# Altium integrated library Altium_WCAP-ATLI_rev19a.IntLib: 162 symbols (part 2 of 2)
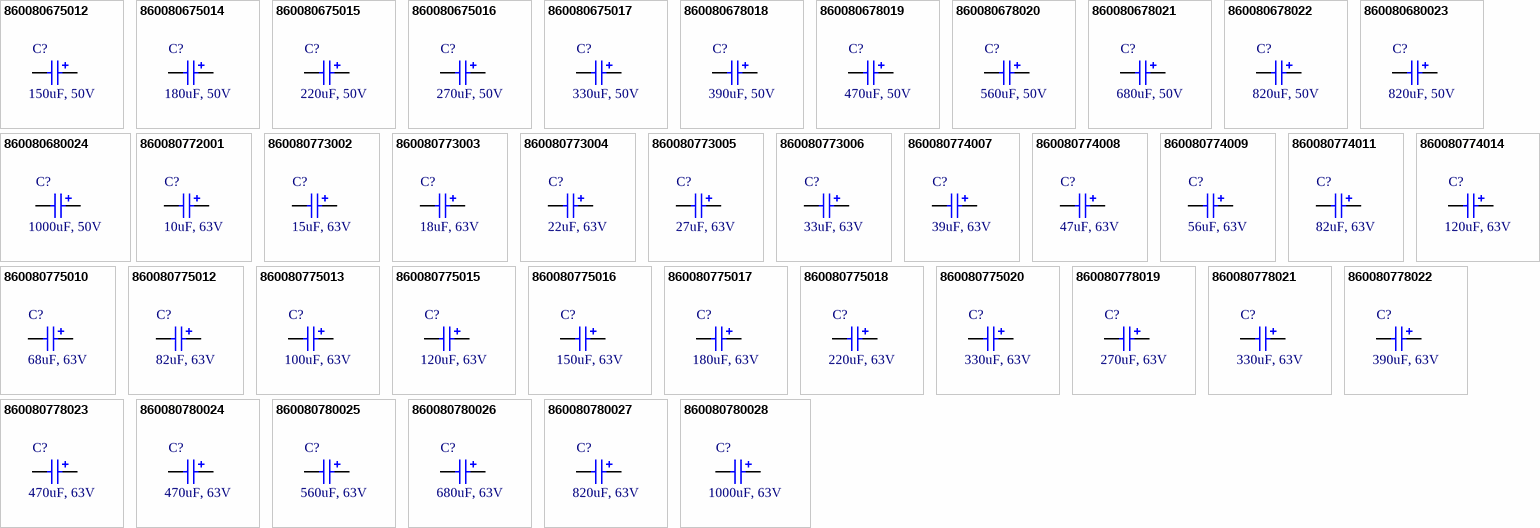
[diagram p5: symbols 860080675012 to 860080780028]

## 860080775010
designator C?, comment 68uF, 63V
WCAP-ATLI THT Aluminum Electrolytic Capacitors, D10mm x L12.5mm, 68uF, +/-20%, 63VDC; Part Number: 860080775010; Dissipation Factor: 8%; Endurance: 5000h; Leakage Current: 42.84uA; Ripple Current max.: 500mA; Technical Reference: ATEF125680M063DSPA9E000; ComponentLink1Description: Manufacturer; ComponentLink1URL: http://www.we-online.de; ComponentLink2Description: Datasheet; ComponentLink2URL: https://katalog.we-online.com/pbs/datasheet/860080775010.pdf; Length: 12.5mm; Mounting Technology: THT; Operating Temperature: -55 to +105degC; Packaging: Ammo Pack; Published Date: August 2019; Capacitance: 68uF; Diameter: 10mm; Publisher: Wurth Elektronik; Capacitance Tolerance: +/-20%; Rated Voltage: 63VDC
footprint WCAP-ATLI_10x12.5
pins: 1 N, 2 P

## 860080775012
designator C?, comment 82uF, 63V
WCAP-ATLI THT Aluminum Electrolytic Capacitors, D10mm x L12.5mm, 82uF, +/-20%, 63VDC; Part Number: 860080775012; Dissipation Factor: 8%; Endurance: 5000h; Leakage Current: 51.66uA; Ripple Current max.: 570mA; Technical Reference: ATEF125820M063DSPA9E000; ComponentLink1Description: Manufacturer; ComponentLink1URL: http://www.we-online.de; ComponentLink2Description: Datasheet; ComponentLink2URL: https://katalog.we-online.com/pbs/datasheet/860080775012.pdf; Length: 12.5mm; Mounting Technology: THT; Operating Temperature: -55 to +105degC; Packaging: Ammo Pack; Published Date: August 2019; Capacitance: 82uF; Diameter: 10mm; Publisher: Wurth Elektronik; Capacitance Tolerance: +/-20%; Rated Voltage: 63VDC
footprint WCAP-ATLI_10x12.5
pins: 1 N, 2 P

## 860080775013
designator C?, comment 100uF, 63V
WCAP-ATLI THT Aluminum Electrolytic Capacitors, D10mm x L12.5mm, 100uF, +/-20%, 63VDC; Part Number: 860080775013; Dissipation Factor: 8%; Endurance: 5000h; Leakage Current: 63uA; Ripple Current max.: 720mA; Technical Reference: ATEF125101M063DSPA9E000; ComponentLink1Description: Manufacturer; ComponentLink1URL: http://www.we-online.de; ComponentLink2Description: Datasheet; ComponentLink2URL: https://katalog.we-online.com/pbs/datasheet/860080775013.pdf; Length: 12.5mm; Mounting Technology: THT; Operating Temperature: -55 to +105degC; Packaging: Ammo Pack; Published Date: August 2019; Capacitance: 100uF; Diameter: 10mm; Publisher: Wurth Elektronik; Capacitance Tolerance: +/-20%; Rated Voltage: 63VDC
footprint WCAP-ATLI_10x12.5
pins: 1 N, 2 P

## 860080775015
designator C?, comment 120uF, 63V
WCAP-ATLI THT Aluminum Electrolytic Capacitors, D10mm x L16mm, 120uF, +/-20%, 63VDC; Part Number: 860080775015; Dissipation Factor: 8%; Endurance: 5000h; Leakage Current: 75.6uA; Ripple Current max.: 835mA; Technical Reference: ATEF160121M063DSPAAE000; ComponentLink1Description: Manufacturer; ComponentLink1URL: http://www.we-online.de; ComponentLink2Description: Datasheet; ComponentLink2URL: https://katalog.we-online.com/pbs/datasheet/860080775015.pdf; Length: 16mm; Mounting Technology: THT; Operating Temperature: -55 to +105degC; Packaging: Ammo Pack; Published Date: August 2019; Capacitance: 120uF; Diameter: 10mm; Publisher: Wurth Elektronik; Capacitance Tolerance: +/-20%; Rated Voltage: 63VDC
footprint WCAP-ATLI_10x16
pins: 1 N, 2 P

## 860080775016
designator C?, comment 150uF, 63V
WCAP-ATLI THT Aluminum Electrolytic Capacitors, D10mm x L16mm, 150uF, +/-20%, 63VDC; Part Number: 860080775016; Dissipation Factor: 8%; Endurance: 5000h; Leakage Current: 94.5uA; Ripple Current max.: 900mA; Technical Reference: ATEF160151M063DSPAAE000; ComponentLink1Description: Manufacturer; ComponentLink1URL: http://www.we-online.de; ComponentLink2Description: Datasheet; ComponentLink2URL: https://katalog.we-online.com/pbs/datasheet/860080775016.pdf; Length: 16mm; Mounting Technology: THT; Operating Temperature: -55 to +105degC; Packaging: Ammo Pack; Published Date: August 2019; Capacitance: 150uF; Diameter: 10mm; Publisher: Wurth Elektronik; Capacitance Tolerance: +/-20%; Rated Voltage: 63VDC
footprint WCAP-ATLI_10x16
pins: 1 N, 2 P

## 860080775017
designator C?, comment 180uF, 63V
WCAP-ATLI THT Aluminum Electrolytic Capacitors, D10mm x L20mm, 180uF, +/-20%, 63VDC; Part Number: 860080775017; Dissipation Factor: 8%; Endurance: 5000h; Leakage Current: 113.4uA; Ripple Current max.: 1200mA; Technical Reference: ATEF200181M063DSPAAE000; ComponentLink1Description: Manufacturer; ComponentLink1URL: http://www.we-online.de; ComponentLink2Description: Datasheet; ComponentLink2URL: https://katalog.we-online.com/pbs/datasheet/860080775017.pdf; Length: 20mm; Mounting Technology: THT; Operating Temperature: -55 to +105degC; Packaging: Ammo Pack; Published Date: August 2019; Capacitance: 180uF; Diameter: 10mm; Publisher: Wurth Elektronik; Capacitance Tolerance: +/-20%; Rated Voltage: 63VDC
footprint WCAP-ATLI_10x20
pins: 1 N, 2 P

## 860080775018
designator C?, comment 220uF, 63V
WCAP-ATLI THT Aluminum Electrolytic Capacitors, D10mm x L25mm, 220uF, +/-20%, 63VDC; Part Number: 860080775018; Dissipation Factor: 8%; Endurance: 5000h; Leakage Current: 138.6uA; Ripple Current max.: 1315mA; Technical Reference: ATEF250221M063DSPAAE000; ComponentLink1Description: Manufacturer; ComponentLink1URL: http://www.we-online.de; ComponentLink2Description: Datasheet; ComponentLink2URL: https://katalog.we-online.com/pbs/datasheet/860080775018.pdf; Length: 25mm; Mounting Technology: THT; Operating Temperature: -55 to +105degC; Packaging: Ammo Pack; Published Date: August 2019; Capacitance: 220uF; Diameter: 10mm; Publisher: Wurth Elektronik; Capacitance Tolerance: +/-20%; Rated Voltage: 63VDC
footprint WCAP-ATLI_10x25
pins: 1 N, 2 P

## 860080775020
designator C?, comment 330uF, 63V
WCAP-ATLI THT Aluminum Electrolytic Capacitors, D10mm x L30mm, 330uF, +/-20%, 63VDC; Part Number: 860080775020; Dissipation Factor: 8%; Endurance: 5000h; Leakage Current: 207.9uA; Ripple Current max.: 1750mA; Technical Reference: ATEF300331M063DSPAAE000; ComponentLink1Description: Manufacturer; ComponentLink1URL: http://www.we-online.de; ComponentLink2Description: Datasheet; ComponentLink2URL: https://katalog.we-online.com/pbs/datasheet/860080775020.pdf; Length: 30mm; Mounting Technology: THT; Operating Temperature: -55 to +105degC; Packaging: Ammo Pack; Published Date: August 2019; Capacitance: 330uF; Diameter: 10mm; Publisher: Wurth Elektronik; Capacitance Tolerance: +/-20%; Rated Voltage: 63VDC
footprint WCAP-ATLI_10x30
pins: 1 N, 2 P

## 860080778019
designator C?, comment 270uF, 63V
WCAP-ATLI THT Aluminum Electrolytic Capacitors, D13mm x L20mm, 270uF, +/-20%, 63VDC; Part Number: 860080778019; Dissipation Factor: 8%; Endurance: 5000h; Leakage Current: 170.1uA; Ripple Current max.: 1400mA; Technical Reference: ATEI200271M063DSPACE000; ComponentLink1Description: Manufacturer; ComponentLink1URL: http://www.we-online.de; ComponentLink2Description: Datasheet; ComponentLink2URL: https://katalog.we-online.com/pbs/datasheet/860080778019.pdf; Length: 20mm; Mounting Technology: THT; Operating Temperature: -55 to +105degC; Packaging: Ammo Pack; Published Date: August 2019; Capacitance: 270uF; Diameter: 13mm; Publisher: Wurth Elektronik; Capacitance Tolerance: +/-20%; Rated Voltage: 63VDC
footprint WCAP-ATLI_13x20
pins: 1 N, 2 P

## 860080778021
designator C?, comment 330uF, 63V
WCAP-ATLI THT Aluminum Electrolytic Capacitors, D13mm x L25mm, 330uF, +/-20%, 63VDC; Part Number: 860080778021; Dissipation Factor: 8%; Endurance: 5000h; Leakage Current: 207.9uA; Ripple Current max.: 1870mA; Technical Reference: ATEI250331M063DSPACE000; ComponentLink1Description: Manufacturer; ComponentLink1URL: http://www.we-online.de; ComponentLink2Description: Datasheet; ComponentLink2URL: https://katalog.we-online.com/pbs/datasheet/860080778021.pdf; Length: 25mm; Mounting Technology: THT; Operating Temperature: -55 to +105degC; Packaging: Ammo Pack; Published Date: August 2019; Capacitance: 330uF; Diameter: 13mm; Publisher: Wurth Elektronik; Capacitance Tolerance: +/-20%; Rated Voltage: 63VDC
footprint WCAP-ATLI_13x25
pins: 1 N, 2 P

## 860080778022
designator C?, comment 390uF, 63V
WCAP-ATLI THT Aluminum Electrolytic Capacitors, D13mm x L25mm, 390uF, +/-20%, 63VDC; Part Number: 860080778022; Dissipation Factor: 8%; Endurance: 5000h; Leakage Current: 245.7uA; Ripple Current max.: 1920mA; Technical Reference: ATEI250391M063DSPACE000; ComponentLink1Description: Manufacturer; ComponentLink1URL: http://www.we-online.de; ComponentLink2Description: Datasheet; ComponentLink2URL: https://katalog.we-online.com/pbs/datasheet/860080778022.pdf; Length: 25mm; Mounting Technology: THT; Operating Temperature: -55 to +105degC; Packaging: Ammo Pack; Published Date: August 2019; Capacitance: 390uF; Diameter: 13mm; Publisher: Wurth Elektronik; Capacitance Tolerance: +/-20%; Rated Voltage: 63VDC
footprint WCAP-ATLI_13x25
pins: 1 N, 2 P

## 860080778023
designator C?, comment 470uF, 63V
WCAP-ATLI THT Aluminum Electrolytic Capacitors, D13mm x L30mm, 470uF, +/-20%, 63VDC; Part Number: 860080778023; Dissipation Factor: 8%; Endurance: 5000h; Leakage Current: 296.1uA; Ripple Current max.: 2225mA; Technical Reference: ATEI300471M063DSPACE000; ComponentLink1Description: Manufacturer; ComponentLink1URL: http://www.we-online.de; ComponentLink2Description: Datasheet; ComponentLink2URL: https://katalog.we-online.com/pbs/datasheet/860080778023.pdf; Length: 30mm; Mounting Technology: THT; Operating Temperature: -55 to +105degC; Packaging: Ammo Pack; Published Date: August 2019; Capacitance: 470uF; Diameter: 13mm; Publisher: Wurth Elektronik; Capacitance Tolerance: +/-20%; Rated Voltage: 63VDC
footprint WCAP-ATLI_13x30
pins: 1 N, 2 P

## 860080780024
designator C?, comment 470uF, 63V
WCAP-ATLI THT Aluminum Electrolytic Capacitors, D16mm x L21mm, 470uF, +/-20%, 63VDC; Part Number: 860080780024; Dissipation Factor: 8%; Endurance: 5000h; Leakage Current: 296.1uA; Ripple Current max.: 1970mA; Technical Reference: ATEK210471M063DSPAEE000; ComponentLink1Description: Manufacturer; ComponentLink1URL: http://www.we-online.de; ComponentLink2Description: Datasheet; ComponentLink2URL: https://katalog.we-online.com/pbs/datasheet/860080780024.pdf; Length: 21mm; Mounting Technology: THT; Operating Temperature: -55 to +105degC; Packaging: Ammo Pack; Published Date: August 2019; Capacitance: 470uF; Diameter: 16mm; Publisher: Wurth Elektronik; Capacitance Tolerance: +/-20%; Rated Voltage: 63VDC
footprint WCAP-ATLI_16x21
pins: 1 N, 2 P

## 860080780025
designator C?, comment 560uF, 63V
WCAP-ATLI THT Aluminum Electrolytic Capacitors, D16mm x L25mm, 560uF, +/-20%, 63VDC; Part Number: 860080780025; Dissipation Factor: 8%; Endurance: 5000h; Leakage Current: 352.8uA; Ripple Current max.: 2350mA; Technical Reference: ATEK250561M063DSPAEE000; ComponentLink1Description: Manufacturer; ComponentLink1URL: http://www.we-online.de; ComponentLink2Description: Datasheet; ComponentLink2URL: https://katalog.we-online.com/pbs/datasheet/860080780025.pdf; Length: 25mm; Mounting Technology: THT; Operating Temperature: -55 to +105degC; Packaging: Ammo Pack; Published Date: August 2019; Capacitance: 560uF; Diameter: 16mm; Publisher: Wurth Elektronik; Capacitance Tolerance: +/-20%; Rated Voltage: 63VDC
footprint WCAP-ATLI_16x25
pins: 1 N, 2 P

## 860080780026
designator C?, comment 680uF, 63V
WCAP-ATLI THT Aluminum Electrolytic Capacitors, D16mm x L31.5mm, 680uF, +/-20%, 63VDC; Part Number: 860080780026; Dissipation Factor: 8%; Endurance: 5000h; Leakage Current: 428.4uA; Ripple Current max.: 2600mA; Technical Reference: ATEK315681M063DSPADE000; ComponentLink1Description: Manufacturer; ComponentLink1URL: http://www.we-online.de; ComponentLink2Description: Datasheet; ComponentLink2URL: https://katalog.we-online.com/pbs/datasheet/860080780026.pdf; Length: 31.5mm; Mounting Technology: THT; Operating Temperature: -55 to +105degC; Packaging: Ammo Pack; Published Date: August 2019; Capacitance: 680uF; Diameter: 16mm; Publisher: Wurth Elektronik; Capacitance Tolerance: +/-20%; Rated Voltage: 63VDC
footprint WCAP-ATLI_16x31.5
pins: 1 N, 2 P

## 860080780027
designator C?, comment 820uF, 63V
WCAP-ATLI THT Aluminum Electrolytic Capacitors, D16mm x L31.5mm, 820uF, +/-20%, 63VDC; Part Number: 860080780027; Dissipation Factor: 8%; Endurance: 5000h; Leakage Current: 516.6uA; Ripple Current max.: 2650mA; Technical Reference: ATEK315821M063DSPADE000; ComponentLink1Description: Manufacturer; ComponentLink1URL: http://www.we-online.de; ComponentLink2Description: Datasheet; ComponentLink2URL: https://katalog.we-online.com/pbs/datasheet/860080780027.pdf; Length: 31.5mm; Mounting Technology: THT; Operating Temperature: -55 to +105degC; Packaging: Ammo Pack; Published Date: August 2019; Capacitance: 820uF; Diameter: 16mm; Publisher: Wurth Elektronik; Capacitance Tolerance: +/-20%; Rated Voltage: 63VDC
footprint WCAP-ATLI_16x31.5
pins: 1 N, 2 P

## 860080780028
designator C?, comment 1000uF, 63V
WCAP-ATLI THT Aluminum Electrolytic Capacitors, D16mm x L35.5mm, 1000uF, +/-20%, 63VDC; Part Number: 860080780028; Dissipation Factor: 8%; Endurance: 5000h; Leakage Current: 630uA; Ripple Current max.: 2780mA; Technical Reference: ATEK355102M063DSPADE000; ComponentLink1Description: Manufacturer; ComponentLink1URL: http://www.we-online.de; ComponentLink2Description: Datasheet; ComponentLink2URL: https://katalog.we-online.com/pbs/datasheet/860080780028.pdf; Length: 35.5mm; Mounting Technology: THT; Operating Temperature: -55 to +105degC; Packaging: Ammo Pack; Published Date: August 2019; Capacitance: 1000uF; Diameter: 16mm; Publisher: Wurth Elektronik; Capacitance Tolerance: +/-20%; Rated Voltage: 63VDC
footprint WCAP-ATLI_16x35.5
pins: 1 N, 2 P

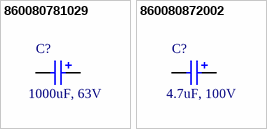
[diagram p4: symbols 860080781029 to 860080872002]

## 860080781029
designator C?, comment 1000uF, 63V
WCAP-ATLI THT Aluminum Electrolytic Capacitors, D18mm x L31.5mm, 1000uF, +/-20%, 63VDC; Part Number: 860080781029; Dissipation Factor: 8%; Endurance: 5000h; Leakage Current: 630uA; Ripple Current max.: 3230mA; Technical Reference: ATEL315102M063DSPAEE000; ComponentLink1Description: Manufacturer; ComponentLink1URL: http://www.we-online.de; ComponentLink2Description: Datasheet; ComponentLink2URL: https://katalog.we-online.com/pbs/datasheet/860080781029.pdf; Length: 31.5mm; Mounting Technology: THT; Operating Temperature: -55 to +105degC; Packaging: Ammo Pack; Published Date: August 2019; Capacitance: 1000uF; Diameter: 18mm; Publisher: Wurth Elektronik; Capacitance Tolerance: +/-20%; Rated Voltage: 63VDC
footprint WCAP-ATLI_18x31.5
pins: 1 N, 2 P

## 860080872002
designator C?, comment 4.7uF, 100V
WCAP-ATLI THT Aluminum Electrolytic Capacitors, D5mm x L11mm, 4.7uF, +/-20%, 100VDC; Part Number: 860080872002; Dissipation Factor: 8%; Endurance: 2000h; Leakage Current: 4.7uA; Ripple Current max.: 125mA; Technical Reference: ATEC1104R7M100DSPA3B0RE; ComponentLink1Description: Manufacturer; ComponentLink1URL: http://www.we-online.de; ComponentLink2Description: Datasheet; ComponentLink2URL: https://katalog.we-online.com/pbs/datasheet/860080872002.pdf; Length: 11mm; Mounting Technology: THT; Operating Temperature: -55 to +105degC; Packaging: Ammo Pack; Published Date: August 2019; Capacitance: 4.7uF; Diameter: 5mm; Publisher: Wurth Elektronik; Capacitance Tolerance: +/-20%; Rated Voltage: 100VDC
footprint WCAP-ATLI_5x11
pins: 1 N, 2 P